# Altium integrated library PlantiumIntegratedLibrary.IntLib: 638 symbols (part 1 of 6)
Pins are listed as number, name and electrical type; pins without a type are passive.

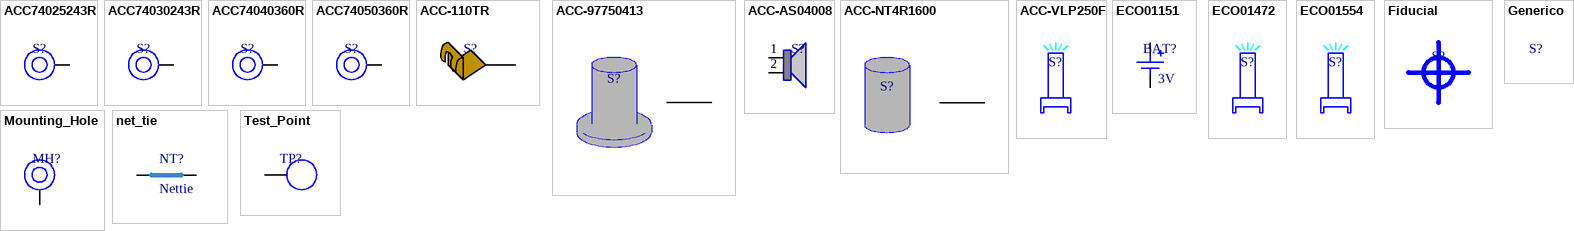
[diagram p0: symbols ACC74025243R to Test_Point]

## ACC74025243R
designator S?
Steel Spacer. Round Standoff Threaded M2x0.4 Steel 0.098" (2.50mm); Manufacturer Part Number: 9774025243R; Manufacturer: Würth Elektronik; Working Temperature: -55º to 150º; Short Description: RND STANDOFF M2X0.4 STEEL 2.5MM; Temperature Coefficient: *; Mounting: SMD; Power: *; Ratings: *; Type: Round Standoff; Frequency: *; Alternate Part Number 1: *; Alternate Part Number 2: *; Tolerance: *; Current: *; Revision Date: 31/03/23; Package Reference: *; Voltage: *; Value: *
footprint 9774025243 (SMT Steel Spacer with internal Thread M2, height 2.5mm)
pins: 1

## ACC74030243R
designator S?
Steel Spacer. Round Standoff Threaded M2x0.4 Steel 0.118" (3.00mm); Manufacturer Part Number: 9774030243R; Manufacturer: Würth Elektronik; Working Temperature: -55º to 150º; Short Description: RND STANDOFF M2X0.4 STEEL 3MM; Temperature Coefficient: *; Mounting: SMD; Power: *; Ratings: *; Type: Round Standoff; Frequency: *; Alternate Part Number 1: *; Alternate Part Number 2: *; Tolerance: *; Current: *; Revision Date: 01/05/23; Package Reference: *; Voltage: *; Value: *
footprint 9774030243 (SMT Steel Spacer with internal Thread M2, height 3mm)
pins: 1

## ACC74040360R
designator S?
Steel Spacer. Round Standoff Threaded M3x0.5 Steel 0.157" (4.00mm); Manufacturer Part Number: 9774040360R; Manufacturer: Würth Elektronik; Working Temperature: -55º to 150º; Short Description: ROUND STANDOFF M3X0.5 STEEL 4MM; Temperature Coefficient: *; Mounting: SMD; Power: *; Ratings: *; Type: Round Standoff; Frequency: *; Alternate Part Number 1: *; Alternate Part Number 2: *; Tolerance: *; Current: *; Revision Date: 31/03/23; Package Reference: *; Voltage: *; Value: *
footprint 9774040360 (Steel Spacer M3 Thread Internal, Length 4mm)
pins: 1

## ACC74050360R
designator S?
Steel Spacer. Round Standoff Threaded M3x0.5 Steel 0.197" (5.00mm); Manufacturer Part Number: 9774050360R; Manufacturer: Würth Elektronik; Working Temperature: -55º to 150º; Short Description: ROUND STANDOFF M3X0.5 STEEL 5MM; Temperature Coefficient: *; Mounting: SMD; Power: *; Ratings: *; Type: Round Standoff; Frequency: *; Alternate Part Number 1: *; Alternate Part Number 2: *; Tolerance: *; Current: *; Revision Date: 01/05/23; Package Reference: *; Voltage: *; Value: *
footprint 9774050360 (M3 Thread Internal, Length 5mm)
pins: 1

## ACC-110TR
designator S?
Battery Contact Spring (Leaf) Multiple 1 Cell SMD (SMT) Tab; Manufacturer Part Number: 110TR; Manufacturer: Keystone Electronics; Working Temperature: NC; Short Description: BATT CONT SPRING MULT 1 CELL SMD; Ratings: REACH, ROHS3; Value: NC; Temperature Coefficient: NC; Mounting: SMT; Power: NC; Type: NC; Frequency: NC; Alternate Part Number 1: *; Alternate Part Number 2: *; Tolerance: NC; Current: NC; Revision Date: 06/05/22; Package Reference: NC; Voltage: NC
footprint 110TR
pins: 1

## ACC-97750413
designator S?
Round Standoff Threaded M3 Steel 0.039" (1.00mm) -; Manufacturer Part Number: *; Working Temperature: *; Temperature Coefficient: *; Mounting: *; Short Description: *; Power: *; Ratings: *; Type: *; Frequency: *; Alternate Part Number 1: *; Alternate Part Number 2: *; Manufacturer: *; Tolerance: *; Current: *; Revision Date: *; Package Reference: *; Voltage: *; Value: *
pins: 0

## ACC-AS04008
designator S?
8 Ohms General Purpose Speaker 2 W 200 Hz ~ 20 kHz Top Oval, Rectangular Frame; Manufacturer Part Number: AS04008CO-WR-R; Manufacturer: PUI Audio, Inc.; Working Temperature: NC; Mounting: NC; Short Description: SPEAKER 8OHM 2W 83DB 20X40MM; Power: 2W; Ratings: ROHS3; Value: NC; Temperature Coefficient: NC; Type: NC; Frequency: 200 Hz ~ 20 kHz; Alternate Part Number 1: *; Alternate Part Number 2: *; Tolerance: NC; Current: NC; Revision Date: 16/11/21; Package Reference: NC; Voltage: NC
pins: 1, 2

## ACC-NT4R1600
designator S?
Connector Standoff For PCI Express Mini Card; Manufacturer Part Number: NT4R1600; Manufacturer: JAE Electronics; Working Temperature: NC; Mounting: NC; Short Description: STANDOFF FOR MM60 SERIES; Ratings: ROHS; Value: NC; Temperature Coefficient: NC; Power: NC; Type: NC; Frequency: NC; Alternate Part Number 1: *; Alternate Part Number 2: *; Tolerance: NC; Current: NC; Revision Date: 03/08/21; Package Reference: NC; Voltage: NC
pins: 0

## ACC-VLP250F
designator S?
Light Pipe Single Clear Rigid Board Mount, Press Fit; Manufacturer Part Number: VLP-250-F; Manufacturer: Bivar Inc.; Working Temperature: NC; Short Description: LIGHT PIPE CLEAR 3MM LENS FLAT; Ratings: ROHS3; Value: NC; Temperature Coefficient: NC; Mounting: THT; Power: NC; Type: NC; Frequency: NC; Alternate Part Number 1: *; Alternate Part Number 2: *; Tolerance: NC; Current: NC; Revision Date: 04/05/22; Package Reference: NC; Voltage: NC
footprint VLP-250-F (Light Pipe Vert SMD Flat Face)

## ECO01151
designator BAT?  value 3V
Battery Lithium coin 3V 20mm horizontal; Manufacturer Part Number: VL-2020/HFN; Manufacturer: Panasonic - BSG; Working Temperature: NC; Short Description: BATT LITH 3V 20MAH COIN 20.0MM; Temperature Coefficient: NC; Mounting: PC Pin (Horizontal Mount); Power: NC; Ratings: NC; Type: NC; Frequency: NC; Alternate Part Number 1: *; Alternate Part Number 2: *; Tolerance: NC; Current: NC; Revision Date: 02/01/22; Package Reference: Coin, 20.0mm; Voltage: 3V; ComponentLink1Description: Datasheet; ComponentLink1URL: https://api.pim.na.industrial.panasonic.com/file_stream/main/fileversion/3570; ComponentLink2Description: Product page; ComponentLink2URL: https://industrial.panasonic.com/ww/products/pt/coin_rechargeable_lithium/models/VL2020
footprint VL-2020/HFN ((21.5mm x 20.3mm x 4.5mm))
pins: 1 (power), 2 (power)

## ECO01472
designator S?
Light Pipe Single Clear Rigid Board Mount, Press Fit; Manufacturer Part Number: VLP-200-F; Manufacturer: Bivar Inc.; Working Temperature: NC; Mounting: NC; Short Description: LIGHT PIPE VERT 0.200" FLAT FACE; Ratings: ROHS3; Value: NC; Temperature Coefficient: NC; Power: NC; Type: NC; Frequency: NC; Alternate Part Number 1: *; Alternate Part Number 2: *; Tolerance: NC; Current: NC; Revision Date: 02/09/21; Package Reference: NC; Voltage: NC
footprint VLP-200-F (Footprint not found)

## ECO01554
designator S?
Light Pipe Single Clear Rigid Board Mount, Press Fit; Manufacturer Part Number: VLP-650-F; Manufacturer: Bivar Inc.; Working Temperature: NC; Short Description: LIGHT PIPE RIGID 3.00MM; Ratings: ROHS; Value: NC; Temperature Coefficient: NC; Mounting: THT; Power: NC; Type: NC; Frequency: NC; Alternate Part Number 1: *; Alternate Part Number 2: *; Tolerance: NC; Current: NC; Revision Date: 14/06/23; Package Reference: NC; Voltage: NC
footprint VLP-650-F

## Fiducial
designator S?  (no BOM)
Fiducial Mark; Working Temperature: NC; Short Description: Fiducail Mark; Value: NC; Temperature Coefficient: NC; Type: NC; Alternate Part Number 1: *; Alternate Part Number 2: *; Tolerance: NC; Revision Date: 31/1/23; Voltage: NC
footprint FIDROUND1X2 (Fiducial rounded 1mm - 2mm)

## Generico
designator S?
Manufacturer Part Number: 9775041360R; Manufacturer: Würth Elektronik; Working Temperature: NC; Mounting: NC; Short Description: ROUND STANDOFF M3 STEEL 1MM; Ratings: ROHS3; Value: NC; Temperature Coefficient: NC; Power: NC; Type: NC; Frequency: NC; Alternate Part Number 1: *; Alternate Part Number 2: *; Tolerance: NC; Current: NC; Revision Date: 03/08/21; Package Reference: NC; Voltage: NC

## Mounting_Hole
designator MH?  (no BOM)
Mounting Hole; Manufacturer Part Number: NC; Mounting: NC; Value: NC; Working Temperature: NC; Temperature Coefficient: NC; Short Description: Mounting Hole; Power: NC; Ratings: NC; Type: NC; Frequency: NC; Alternate Part Number 1: NC; Alternate Part Number 2: NC; Manufacturer: NC; Tolerance: NC; Current: NC; Revision Date: 03/04/23; Package Reference: NC; Voltage: NC
footprint mounting_hole
footprint MOUNTING_HOLE_3MM
pins: 1

## net_tie
designator NT?, comment Nettie  (net tie, no BOM)
There are situations when you need to intentionally connect two different nets. This is not a simple naming issue. It is when two nets need to be shorted as a design requirement. An example could be when you need to connect an Analog ground and a Digital ground in a controlled way.
footprint NETTIE
pins: 1, 2

## Test_Point
designator TP?  (no BOM)
Test point; Manufacturer Part Number: NC; Mounting: NC; Value: NC; Working Temperature: NC; Temperature Coefficient: NC; Short Description: Test point; Power: NC; Ratings: NC; Type: NC; Frequency: NC; Alternate Part Number 1: NC; Alternate Part Number 2: NC; Manufacturer: NC; Tolerance: NC; Current: NC; Revision Date: 03/04/23; Package Reference: NC; Voltage: NC
footprint Test_point
pins: 1


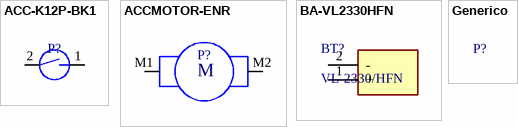
[diagram p1: symbols ACC-K12P-BK1 to Generico]

## ACC-K12P-BK1
designator P?
Manufacturer Part Number: K12P BK 1.5 5N; Manufacturer: C&K; Working Temperature: -40°C ~ 85°C; Temperature Coefficient: NC; Short Description: SWITCH PUSH SPST-NO 0.1A 30V; Ratings: REACH, ROHS3; Current: 100mA; Voltage: 30V; Value: NC; Mounting: THT; Power: NC; Type: Keyswitch; Frequency: NC; Alternate Part Number 1: *; Alternate Part Number 2: *; Tolerance: NC; Revision Date: 03/08/21; Package Reference: *
footprint K12P BK 1.5 5N
pins: 1, 2

## ACCMOTOR-ENR
designator P?
Micro Metal Gearmotors, 12 CPR, 2.7-18V; Manufacturer Part Number: *; Working Temperature: *; Temperature Coefficient: *; Mounting: SMT; Short Description: *; Power: *; Ratings: *; Type: *; Frequency: *; Alternate Part Number 1: *; Alternate Part Number 2: *; Manufacturer: *; Tolerance: *; Current: *; Revision Date: 15/10/21; Package Reference: *; Voltage: *; Value: *
footprint MOTOR_ENR (Footprint not found)
pins: M1 1, M2 2
text: M

## BA-VL2330HFN
designator BT?, comment VL-2330/HFN
Coin Cell Battery 3V 50mAH RECHG W/TABS. Vanadium Pentoxide Lithium; Manufacturer_Name: Panasonic; Datasheet Link: https://industrial.panasonic.com/ww/products/pt/coin_rechargeable_lithium/models/VL2020; Height: 4.05mm; Manufacturer_Part_Number: VL-2330/HFN; Mounting: Through hole
footprint VL2330HFN
pins: 1 +, 2 -

## Generico
designator P?
Manufacturer Part Number: *; Working Temperature: *; Temperature Coefficient: *; Mounting: *; Short Description: *; Power: *; Ratings: *; Type: *; Frequency: *; Alternate Part Number 1: *; Alternate Part Number 2: *; Manufacturer: *; Tolerance: *; Current: *; Revision Date: *; Package Reference: *; Voltage: *; Value: *


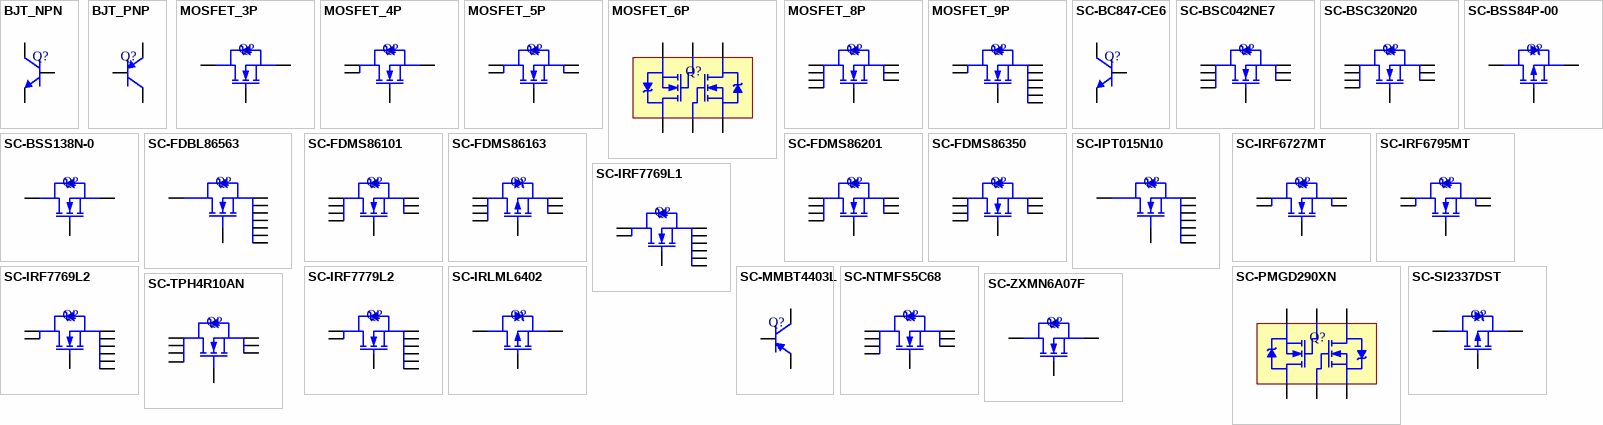
[diagram p2: symbols BJT_NPN to SC-ZXMN6A07F]

## BJT_NPN
designator Q?
Manufacturer Part Number: *; Working Temperature: *; Temperature Coefficient: *; Short Description: *; Power: *; Ratings: *; Type: *; Frequency: *; Alternate Part Number 1: *; Alternate Part Number 2: *; Manufacturer: *; Tolerance: *; Current: *; Revision Date: 04/08/21; Package Reference: *; Voltage: *; Value: *
pins: 1 B, 2 E, 3 C

## BJT_PNP
designator Q?
Manufacturer Part Number: *; Working Temperature: *; Temperature Coefficient: *; Short Description: *; Power: *; Ratings: *; Type: *; Frequency: *; Alternate Part Number 1: *; Alternate Part Number 2: *; Manufacturer: *; Tolerance: *; Current: *; Revision Date: 04/08/21; Package Reference: *; Voltage: *; Value: *
pins: 1 B, 2 E, 3 C

## MOSFET_3P
designator Q?
Manufacturer Part Number: *; Working Temperature: *; Temperature Coefficient: *; Short Description: *; Power: *; Ratings: *; Type: *; Frequency: *; Alternate Part Number 1: *; Alternate Part Number 2: *; Manufacturer: *; Tolerance: *; Current: *; Revision Date: 04/08/21; Package Reference: *; Voltage: *; Value: *
pins: 1 S, 2 G, 3 D

## MOSFET_4P
designator Q?
Manufacturer Part Number: *; Working Temperature: *; Temperature Coefficient: *; Short Description: *; Power: *; Ratings: *; Type: *; Frequency: *; Alternate Part Number 1: *; Alternate Part Number 2: *; Manufacturer: *; Tolerance: *; Current: *; Revision Date: 04/08/21; Package Reference: *; Voltage: *; Value: *
pins: 1 S, 2 D, 3 D, 4 G

## MOSFET_5P
designator Q?
Manufacturer Part Number: *; Working Temperature: *; Temperature Coefficient: *; Short Description: *; Power: *; Ratings: *; Type: *; Frequency: *; Alternate Part Number 1: *; Alternate Part Number 2: *; Manufacturer: *; Tolerance: *; Current: *; Revision Date: 04/08/21; Package Reference: *; Voltage: *; Value: *
pins: 1 S, 2 S, 3 D, 4 D, 5 G

## MOSFET_6P
designator Q?
Manufacturer Part Number: *; Working Temperature: *; Temperature Coefficient: *; Short Description: *; Power: *; Ratings: *; Type: *; Frequency: *; Alternate Part Number 1: *; Alternate Part Number 2: *; Manufacturer: *; Tolerance: *; Current: *; Revision Date: 04/08/21; Package Reference: *; Voltage: *; Value: *
pins: 1 S, 2 G, 3 D, 4 S, 5 G, 6 D

## MOSFET_8P
designator Q?
Manufacturer Part Number: *; Working Temperature: *; Temperature Coefficient: *; Short Description: *; Power: *; Ratings: *; Type: *; Frequency: *; Alternate Part Number 1: *; Alternate Part Number 2: *; Manufacturer: *; Tolerance: *; Current: *; Revision Date: 04/08/21; Package Reference: *; Voltage: *; Value: *
pins: 1 S, 2 S, 3 S, 4 G, 5 D, 6 D, 7 D, 8 D

## MOSFET_9P
designator Q?
Manufacturer Part Number: *; Working Temperature: *; Temperature Coefficient: *; Short Description: *; Power: *; Ratings: *; Type: *; Frequency: *; Alternate Part Number 1: *; Alternate Part Number 2: *; Manufacturer: *; Tolerance: *; Current: *; Revision Date: 04/08/21; Package Reference: *; Voltage: *; Value: *
pins: 1 S, 2 S, 3 S, 4 S, 5 S, 6 S, 7 D, 8 D, 9 G

## SC-BC847-CE6
designator Q?
Bipolar (BJT) Transistor NPN 45 V 100 mA 250MHz 330 mW Surface Mount SOT-23-3; Manufacturer Part Number: BC847CE6327; Alternate Part Number 1: ND; Manufacturer: Infineon Technologies; Working Temperature: 150°C (TJ); Temperature Coefficient: NC; Short Description: TRANS NPN 45V 100MA SOT23-3; Power: 330 mW; Ratings: REACH, ROHS3; Current: 100mA; Voltage: 45V; Value: 420; Mounting: SMT; Type: NPN; Frequency: NC; Alternate Part Number 2: ND; Tolerance: NC; Revision Date: 04/08/21; Package Reference: SOT-23-3
footprint SOT-23-3
pins: 1 B, 2 E, 3 C

## SC-BSC042NE7
designator Q?
N-Channel 75 V 19A (Ta), 100A (Tc) 2.5W (Ta), 125W (Tc) Surface Mount PG-TDSON-8-1; Manufacturer Part Number: BSC042NE7NS3GATMA1; Alternate Part Number 1: ND; Manufacturer: Infineon Technologies; Working Temperature: -55°C ~ 150°C (TJ); Temperature Coefficient: NC; Short Description: MOSFET N-CH 75V 19A/100A TDSON; Ratings: REACH, ROHS3; Voltage: 75V; Value: 4.2m; Mounting: SMT; Power: 2.5W (Ta), 125W (Tc); Type: N-Channel; Frequency: NC; Alternate Part Number 2: ND; Tolerance: NC; Current: 19A (Ta), 100A (Tc); Revision Date: 04/08/21; Package Reference: PowerTDFN-8
footprint PQFN-8
pins: 1 S, 2 S, 3 S, 4 G, 5 D, 6 D, 7 D, 8 D

## SC-BSC320N20
designator Q?
N-Channel 200 V 36A (Tc) 125W (Tc) Surface Mount PG-TDSON-8-1; Manufacturer Part Number: BSC320N20NS3 G; Alternate Part Number 1: ND; Manufacturer: Infineon Technologies; Working Temperature: -55°C ~ 150°C (TJ); Temperature Coefficient: NC; Short Description: MOSFET N-CH 200V 36A TDSON-8; Ratings: REACH, ROHS3; Voltage: 200V; Value: 32m; Mounting: SMT; Power: 125W (Tc); Type: N-Channel; Frequency: NC; Alternate Part Number 2: ND; Tolerance: NC; Current: 36A (Tc); Revision Date: 04/08/21; Package Reference: PowerTDFN-8
footprint PQFN-8
pins: 1 S, 2 S, 3 S, 4 G, 5 D, 6 D, 7 D, 8 D

## SC-BSS84P-00
designator Q?
P-Channel 50 V 130mA (Ta) 250mW (Tc) Surface Mount TO-236AB; Manufacturer Part Number: BSS84PH6433XTMA1; Alternate Part Number 1: BSS84,215; Alternate Part Number 2: ND; Manufacturer: Nexperia USA Inc.; Working Temperature: -65°C ~ 150°C (TJ); Temperature Coefficient: NC; Short Description: MOSFET P-CH 50V 130MA TO236AB; Ratings: REACH, ROHS3; Voltage: 50V; Value: 10; Mounting: SMT; Power: 250mW (Tc); Type: P-Channel; Frequency: NC; Tolerance: NC; Current: 130mA (Ta); Revision Date: 04/08/21; Package Reference: SOT-23-3
footprint SOT-23-3
pins: 1 G, 2 S, 3 D

## SC-BSS138N-0
designator Q?
N-Channel 60 V 230mA (Ta) 360mW (Ta) Surface Mount SOT-23-3; Manufacturer Part Number: BSS138N H6327; Alternate Part Number 1: ND; Manufacturer: Infineon Technologies; Working Temperature: -55°C ~ 150°C (TJ); Temperature Coefficient: NC; Short Description: MOSFET N-CH 60V 230MA SOT23-3; Ratings: REACH, ROHS3; Voltage: 60V; Value: 3.5; Mounting: SMT; Power: 360mW (Ta); Type: N-Channel; Frequency: NC; Alternate Part Number 2: ND; Tolerance: NC; Current: 230mA (Ta); Revision Date: 04/08/21; Package Reference: SOT-23-3
footprint SOT-23-3
pins: 1 G, 2 S, 3 D

## SC-FDBL86563
designator Q?
N-Channel 60 V 240A (Tc) 357W (Tj) Surface Mount PG-HSOF-8-1; Manufacturer Part Number: FDBL86563-F085; Alternate Part Number 1: ND; Manufacturer: onsemi; Working Temperature: -55°C ~ 175°C (TJ); Temperature Coefficient: NC; Short Description: MOSFET N-CH 60V 240A 8HPSOF; Ratings: REACH, ROHS3; Voltage: 60V; Value: 1,5mOhm; Mounting: SMT; Power: 357W (Tj); Type: N-Channel; Frequency: NC; Alternate Part Number 2: ND; Tolerance: NC; Current: 240A (Tc); Revision Date: 04/04/23; Package Reference: PG-HSOF-8
footprint PG-HSOF-8
pins: 1 G, 2 S, 3 S, 4 S, 5 S, 6 S, 7 S, 8 S, TAP D

## SC-FDMS86101
designator Q?
N-Channel 100 V 12.4A (Ta), 60A (Tc) 2.5W (Ta), 104W (Tc) Surface Mount 8-PQFN (5x6); Manufacturer Part Number: FDMS86101; Alternate Part Number 1: ND; Manufacturer: ON Semiconductor; Working Temperature: -55°C ~ 150°C (TJ); Temperature Coefficient: NC; Short Description: MOSFET N-CH 100V 12.4A/60A 8PQFN; Ratings: REACH, ROHS3; Voltage: 100V; Value: 8m; Mounting: SMT; Power: 2.5W (Ta), 104W (Tc); Type: N-Channel; Frequency: NC; Alternate Part Number 2: ND; Tolerance: NC; Current: 12.4A (Ta), 60A (Tc); Revision Date: 04/08/21; Package Reference: PowerTDFN-8
footprint PQFN-8
pins: 1 S, 2 S, 3 S, 4 G, 5 D, 6 D, 7 D, 8 D

## SC-FDMS86163
designator Q?
P-Channel 100 V 7.9A (Ta), 50A (Tc) 2.5W (Ta), 104W (Tc) Surface Mount 8-PQFN (5x6); Manufacturer Part Number: FDMS86163P; Alternate Part Number 1: ND; Manufacturer: ON Semiconductor; Working Temperature: -55°C ~ 150°C (TJ); Temperature Coefficient: NC; Short Description: MOSFET P-CH 100V 7.9A/50A 8PQFN; Ratings: REACH, ROHS3; Voltage: 100V; Value: 8m; Mounting: SMT; Power: 2.5W (Ta), 104W (Tc); Type: P-Channel; Frequency: NC; Alternate Part Number 2: ND; Tolerance: NC; Current: 7.9A (Ta), 50A (Tc); Revision Date: 20/09/21; Package Reference: PowerTDFN-8
footprint PQFN-8
pins: 1 S, 2 S, 3 S, 4 G, 5 D, 6 D, 7 D, 8 D

## SC-FDMS86201
designator Q?  (value not drawn)
N-Channel 120 V 11.6A (Ta), 49A (Tc) 2.5W (Ta), 104W (Tc) Surface Mount 8-PQFN (5x6); Alternate Part Number 1: ND; Manufacturer: ON Semiconductor; Working Temperature: -55°C ~ 150°C (TJ); Temperature Coefficient: NC; Short Description: MOSFET N-CH 120V 11.6A/49A 8PQFN; Ratings: REACH, ROHS3; Current: 11.6A (Ta), 60A (Tc); Voltage: 120V; Value: 8m; Manufacturer Part Number: FDMS86201; Mounting: SMT; Power: 2.5W (Ta), 104W (Tc); Type: N-Channel; Frequency: NC; Alternate Part Number 2: ND; Tolerance: NC; Revision Date: 04/08/21; Package Reference: PowerTDFN-8
footprint PQFN-8
pins: 1 S, 2 S, 3 S, 4 G, 5 D, 6 D, 7 D, 8 D

## SC-FDMS86350
designator Q?
N-Channel 80 V 25A (Ta), 198A (Tc) 3.3W (Ta), 187W (Tc) Surface Mount 8-PQFN (5x6); Manufacturer Part Number: FDMS86350ET80; Alternate Part Number 1: ND; Manufacturer: ON Semiconductor; Working Temperature: -55°C ~ 175°C (TJ); Temperature Coefficient: NC; Short Description: MOSFET N-CH 80V 25A/198A POWER56; Ratings: REACH, ROHS3; Voltage: 80V; Value: 2.4m; Mounting: SMT; Power: 3.3W (Ta), 187W (Tc); Type: N-Channel; Frequency: NC; Alternate Part Number 2: ND; Tolerance: NC; Current: 25A (Ta), 198A (Tc); Revision Date: 04/08/21; Package Reference: PowerTDFN-8
footprint PQFN-8
pins: 1 S, 2 S, 3 S, 4 G, 5 D, 6 D, 7 D, 8 D

## SC-IPT015N10
designator Q?
N-Channel 100 V 300A (Tc) 375W (Tc) Surface Mount PG-HSOF-8-1; Manufacturer Part Number: IPT015N10N5ATMA1; Alternate Part Number 1: ND; Manufacturer: Infineon Technologies; Working Temperature: -55°C ~ 175°C (TJ); Temperature Coefficient: NC; Short Description: MOSFET N-CH 100V 300A 8HSOF; Ratings: REACH, ROHS3; Voltage: 100V; Value: 1,5mOhm; Mounting: SMT; Power: 375W (Tc); Type: N-Channel; Frequency: NC; Alternate Part Number 2: ND; Tolerance: NC; Current: 300A (Tc); Revision Date: 03/04/23; Package Reference: PG-HSOF-8
footprint PG-HSOF-8
pins: 1 G, 2 S, 3 S, 4 S, 5 S, 6 S, 7 S, 8 S, TAP D

## SC-IRF6727MT
designator Q?
N-Channel 30 V 32A (Ta), 180A (Tc) 2.8W (Ta), 89W (Tc) Surface Mount DIRECTFET™ MX; Manufacturer Part Number: IRF6727MTRPBF; Alternate Part Number 1: ND; Manufacturer: Infineon Technologies; Working Temperature: -40°C ~ 150°C (TJ); Temperature Coefficient: NC; Short Description: MOSFET N-CH 30V 32A DIRECTFET; Ratings: REACH, ROHS3; Voltage: 30V; Value: 1.7m; Mounting: SMT; Power: 2.8W (Ta), 89W (Tc); Type: N-Channel; Frequency: NC; Alternate Part Number 2: ND; Tolerance: NC; Current: 32A (Ta), 180A (Tc); Revision Date: 04/08/21; Package Reference: DIRECTFET
footprint DIRECTFET-MX
pins: 1 G, 2 S, 2 S, 3 D, 3 D

## SC-IRF6795MT
designator Q?
N-Channel 25 V 32A (Ta), 160A (Tc) 2.8W (Ta), 75W (Tc) Surface Mount DIRECTFET™ MX; Manufacturer Part Number: IRF6795MTRPBF; Alternate Part Number 1: ND; Manufacturer: Infineon Technologies; Working Temperature: -40°C ~ 150°C (TJ); Temperature Coefficient: NC; Short Description: MOSFET N-CH 25V 32A DIRECTFET; Ratings: REACH, ROHS3; Voltage: 25V; Value: 1.8m; Mounting: SMT; Power: 2.8W (Ta), 75W (Tc); Type: N-Channel; Frequency: NC; Alternate Part Number 2: ND; Tolerance: NC; Current: 32A (Ta), 160A (Tc); Revision Date: 04/08/21; Package Reference: DIRECTFET
footprint DIRECTFET-MX
pins: 1 G, 2 S, 2 S, 3 D, 3 D

## SC-IRF7769L1
designator Q?
N-Channel 25 V 22A (Ta), 95A (Tc) 2.2W (Ta), 42W (Tc) Surface Mount DIRECTFET™ SQ; Manufacturer Part Number: IRF7769L1TRPBF; Alternate Part Number 1: ND; Manufacturer: Infineon Technologies; Working Temperature: -40°C ~ 150°C (TJ); Temperature Coefficient: NC; Short Description: MOSFET N-CH 25V 22A DIRECTFET; Ratings: REACH; Voltage: 25V; Value: 3m; Mounting: SMT; Power: 2.2W (Ta), 42W (Tc); Type: N-Channel; Frequency: NC; Alternate Part Number 2: ND; Tolerance: NC; Current: 22A (Ta), 95A (Tc); Revision Date: 04/08/21; Package Reference: DIRECTFET
footprint DIRECTFET-L8
pins: 1 G, 2 S, 2 S, 2 S, 2 S, 2 S, 2 S, 3 D, 3 D

## SC-IRF7769L2
designator Q?
N-Channel 100 V 375A (Tc) 3.3W (Ta), 125W (Tc) Surface Mount DirectFET™ Isometric L8; Manufacturer Part Number: IRF7769L2TR1PBF; Alternate Part Number 1: ND; Manufacturer: Infineon Technologies; Working Temperature: -55°C ~ 175°C (TJ); Temperature Coefficient: NC; Short Description: MOSFET N-CH 100V 375A DIRECTFET; Ratings: REACH; Voltage: 100V; Value: 3.5m; Mounting: SMT; Power: 3.3W (Ta), 125W (Tc); Type: N-Channel; Frequency: NC; Alternate Part Number 2: ND; Tolerance: NC; Current: 375A (Tc); Revision Date: 04/08/21; Package Reference: DIRECTFET
footprint DIRECTFET-L8
pins: 1 G, 2 S, 2 S, 2 S, 2 S, 2 S, 2 S, 3 D, 3 D

## SC-IRF7779L2
designator Q?
N-Channel 150 V 67A (Tc) 3.3W (Ta), 125W (Tc) Surface Mount DirectFET™ Isometric L8; Manufacturer Part Number: IRF7779L2TRPBF; Alternate Part Number 1: ND; Manufacturer: Infineon Technologies; Working Temperature: -55°C ~ 175°C (TJ); Temperature Coefficient: NC; Short Description: MOSFET N-CH 150V 375A DIRECTFET; Ratings: REACH; Voltage: 150V; Value: 3.5m11mOhm @ 40A, 10V; Mounting: SMT; Power: 3.3W (Ta), 125W (Tc); Type: N-Channel; Frequency: NC; Alternate Part Number 2: ND; Tolerance: NC; Current: 67A (Tc); Revision Date: 04/08/22; Package Reference: DIRECTFET
footprint DIRECTFET-L8
pins: 1 G, 2 S, 2 S, 2 S, 2 S, 2 S, 2 S, 3 D, 3 D

## SC-IRLML6402
designator Q?
P-Channel 20 V 3.7A (Ta) 1.3W (Ta) Surface Mount Micro3™/SOT-23; Manufacturer Part Number: IRLML6402TRPBF; Alternate Part Number 1: ND; Manufacturer: Infineon Technologies; Working Temperature: -55°C ~ 150°C (TJ); Temperature Coefficient: NC; Short Description: MOSFET P-CH 20V 3.7A SOT23; Ratings: REACH, ROHS3; Voltage: 20V; Value: 65m; Mounting: SMT; Power: 1.3W (Ta); Type: P-Channel; Frequency: NC; Alternate Part Number 2: ND; Tolerance: NC; Current: 3.7A (Ta); Revision Date: 04/08/21; Package Reference: SOT-23-3
footprint SOT-23-3
pins: 1 G, 2 S, 3 D

## SC-MMBT4403L
designator Q?
Bipolar (BJT) Transistor PNP 40 V 600 mA 200MHz 300 mW Surface Mount SOT-23-3 (TO-236); Manufacturer Part Number: MMBT4403LT1G; Alternate Part Number 1: ND; Manufacturer: ON Semiconductor; Working Temperature: -55°C ~ 150°C (TJ); Temperature Coefficient: NC; Short Description: TRANS PNP 40V 600MA SOT23-3; Power: 300mW; Ratings: REACH, ROHS3; Current: 600mA; Voltage: 40V; Value: 100; Mounting: SMT; Type: PNP; Frequency: NC; Alternate Part Number 2: ND; Tolerance: NC; Revision Date: 04/08/21; Package Reference: SOT-23-3
footprint SOT-23-3
pins: 1 B, 2 E, 3 C

## SC-NTMFS5C68
designator Q?
N-Channel 25A (Tc) 28W (Tc) Surface Mount 5-DFN (5x6) (8-SOFL); Manufacturer Part Number: NTMFS5C682NLT1G; Alternate Part Number 1: ND; Manufacturer: ON Semiconductor; Working Temperature: -55°C ~ 175°C (TJ); Temperature Coefficient: NC; Short Description: MOSFET N-CH 60V 25A 5DFN; Ratings: REACH, ROHS3; Voltage: 60V; Value: NC; Mounting: SMT; Power: 28W (Tc); Type: N-Channel; Frequency: NC; Alternate Part Number 2: ND; Tolerance: NC; Current: 25A (Tc); Revision Date: 20/09/21; Package Reference: PowerTDFN-8
footprint PQFN-8
pins: 1 S, 2 S, 3 S, 4 G, 5 D, 6 D, 7 D, 8 D

## SC-PMGD290XN
designator Q?
Mosfet Array 2 N-Channel (Dual) 20V 860mA 410mW Surface Mount 6-TSSOP; Manufacturer Part Number: PMGD290XN T/R; Alternate Part Number 1: ND; Manufacturer: Nexperia USA Inc.; Working Temperature: -55°C ~ 150°C (TJ); Temperature Coefficient: NC; Short Description: MOSFET 2N-CH 20V 0.86A 6TSSOP; Ratings: REACH, ROHS3; Value: 350m; Mounting: SMT; Power: 410mW; Type: N-Channel (Dual); Frequency: NC; Alternate Part Number 2: ND; Tolerance: NC; Current: 860mA; Revision Date: 04/08/21; Package Reference: TSSOP-6; Voltage: 20V
footprint SOT-363-6
pins: 1 S, 2 G, 3 D, 4 S, 5 G, 6 D

## SC-SI2337DST
designator Q?, comment SI2337DS-T1-E3  (value not drawn)
P-Channel 80 V 2.2A (Tc) 760mW (Ta), 2.5W (Tc) Surface Mount SOT-23-3 (TO-236); Manufacturer Part Number: IRLML6402TRPBF; Alternate Part Number 1: ND; Manufacturer: Infineon Technologies; Working Temperature: -55°C ~ 150°C (TJ); Temperature Coefficient: NC; Short Description: MOSFET P-CH 20V 3.7A SOT23; Power: 1.3W (Ta); Ratings: REACH, ROHS3; Current: 3.7A (Ta); Voltage: 20V; Value: 65m; Mounting: SMT; Type: P-Channel; Frequency: NC; Alternate Part Number 2: ND; Tolerance: NC; Revision Date: 04/08/21; Package Reference: SOT-23-3
footprint SOT-23-3
pins: 1 G, 2 S, 3 D

## SC-TPH4R10AN
designator Q?
N-Channel 100 V 70A (Tc) 67W (Tc) Surface Mount 2-5Q1S; Manufacturer Part Number: TPH4R10ANL; Alternate Part Number 1: ND; Manufacturer: TOSHIBA; Working Temperature: -55°C ~ 150°C (TJ); Temperature Coefficient: NC; Short Description: MOSFET N-CH 100V 300A 8HSOF; Ratings: REACH, ROHS3; Voltage: 100V; Value: 3,3mOhm; Mounting: SMT; Power: 67W (Tc); Type: N-Channel; Alternate Part Number 2: ND; Tolerance: NC; Current: 70A (Tc); Revision Date: 03/04/23; Package Reference: 2-5Q1S (SOP Advance); ComponentLink1Description: Datasheet; ComponentLink1URL: https://toshiba.semicon-storage.com/info/TPH4R10ANL_datasheet_en_20191018.pdf?did=55592&prodName=TPH4R10ANL
footprint PQFN-8
pins: 1 S, 2 S, 3 S, 4 G, 5 D, 6 D, 7 D, 8 D

## SC-ZXMN6A07F
designator Q?
N-Channel 60 V 1.2A (Ta) 625mW (Ta) Surface Mount SOT-23-3; Manufacturer Part Number: ZXMN6A07FTA; Alternate Part Number 1: ND; Manufacturer: Diodes Incorporated; Working Temperature: -55°C ~ 150°C (TJ); Temperature Coefficient: NC; Short Description: MOSFET N-CH 60V 1.2A SOT23-3; Ratings: REACH, ROHS3; Voltage: 60V; Value: 250m; Mounting: SMT; Power: 625mW (Ta); Type: N-Channel; Frequency: NC; Alternate Part Number 2: ND; Tolerance: NC; Current: 1.2A (Ta); Revision Date: 04/08/21; Package Reference: SOT-23-3
footprint SOT-23-3
pins: 1 G, 2 S, 3 D


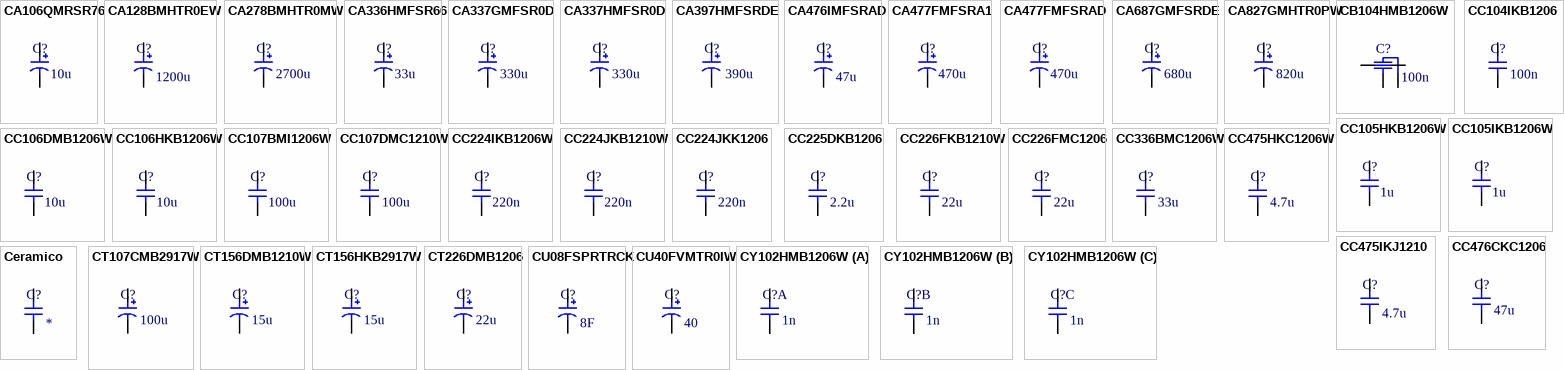
[diagram p3: symbols CA106QMRSR76 to CY102HMB1206W]

## CA106QMRSR76
designator C?  value 10u
10 µF 63 V Aluminum Electrolytic Capacitors Radial, Can - SMD - 2000 Hrs @ 85°C; Manufacturer Part Number: EDK106M063A9GAA; Manufacturer: KEMET; Working Temperature: -40°C ~ 85°C; Temperature Coefficient: NA; Short Description: CAP ALUM 10UF 20% 63V SMD; Power: NC; Ratings: REACH, ROHS3; Type: Aluminium; Tolerance: ±20%; Voltage: 63V; Mounting: SMT; Frequency: NC; Alternate Part Number 1: *; Alternate Part Number 2: *; Current: NC; Revision Date: 23/02/22; Package Reference: Radial
footprint C066x066-032x016(061) (Footprint not found)
pins: 1, 2

## CA128BMHTR0EW
designator C?  value 1200u
1200 µF 6.3 V Aluminum Electrolytic Capacitors Radial, Can - 6000 Hrs @ 105°C; Manufacturer Part Number: EEU-FR0J122B; Manufacturer: Panasonic Electronic Components; Working Temperature: -40°C ~ 105°C; Short Description: CAP ALUM 1200UF 20% 6.3V RADIAL; Power: NC; Ratings: REACH, ROHS3; Tolerance: ±20%; Voltage: 6.3 V; Temperature Coefficient: *; Mounting: THT; Type: *; Frequency: NC; Alternate Part Number 1: *; Alternate Part Number 2: *; Current: NC; Revision Date: 15/11/21; Package Reference: *
footprint C_THRAD_020x008x050
pins: 1, 2

## CA278BMHTR0MW
designator C?  value 2700u
2700 µF 6.3 V Aluminum Electrolytic Capacitors Radial, Can - 10000 Hrs @ 105°C; Manufacturer Part Number: UHW0J272MPD; Manufacturer: Nichicon; Working Temperature: -40°C ~ 105°C; Temperature Coefficient: NC; Short Description: CAP ALUM 2700UF 20% 6.3V RADIAL; Ratings: REACH, ROHS3; Type: Aluminium; Tolerance: ±20%; Voltage: 6.3V; Mounting: THT; Power: NC; Frequency: NC; Alternate Part Number 1: *; Alternate Part Number 2: *; Current: NC; Revision Date: 12/11/21; Package Reference: Radial
footprint C_THRAD_020x008x050
pins: 1, 2

## CA336HMFSR66
designator C?  value 33u
33 µF 50 V Aluminum Electrolytic Capacitors Radial, Can - SMD 880mOhm @ 100kHz 2000 Hrs @ 105°C; Manufacturer Part Number: EEE-FN1H330L; Manufacturer: Panasonic Electronic Components; Working Temperature: -55°C ~ 105°C; Temperature Coefficient: NA; Short Description: CAP ALUM 33UF 20% 50V SMD; Power: NC; Ratings: REACH, ROHS3, AEQ-200; Type: Aluminium; Tolerance: ±20%; Voltage: 50V; Mounting: SMT; Frequency: NC; Alternate Part Number 1: *; Alternate Part Number 2: *; Current: NC; Revision Date: 20/09/21; Package Reference: Radial
footprint C066x066-032x016(061) (Footprint not found)
pins: 1, 2

## CA337GMFSR0D
designator C?  value 330u
330 µF 35 V Aluminum Electrolytic Capacitors Radial, Can - SMD - 2000 Hrs @ 105°C; Manufacturer Part Number: EEE-FK1V331AP; Manufacturer: Panasonic Electronic Components; Working Temperature: -55°C ~ 105°C; Temperature Coefficient: NA; Short Description: CAP ALUM 330UF 20% 35V SMD; Power: NC; Ratings: REACH, ROHS3, AEQ-200; Type: Aluminium; Tolerance: ±20%; Voltage: 35V; Mounting: SMT; Frequency: NC; Alternate Part Number 1: *; Alternate Part Number 2: *; Current: NC; Revision Date: 22/12/21; Package Reference: Radial
footprint C103x103-041x020(105) (Footprint not found)
pins: 1, 2

## CA337HMFSR0D
designator C?  value 330u
330 µF 50 V Aluminum Electrolytic Capacitors Radial, Can - SMD 120mOhm @ 100kHz 2000 Hrs @ 105°C; Manufacturer Part Number: EEE-FT1H331AP; Manufacturer: Panasonic Electronic Components; Working Temperature: -55°C ~ 105°C; Temperature Coefficient: NA; Short Description: CAP ALUM 330UF 20% 50V SMD; Power: NC; Ratings: REACH, ROHS3, AEQ-200; Type: Aluminium; Tolerance: ±20%; Voltage: 50V; Mounting: SMT; Frequency: NC; Alternate Part Number 1: *; Alternate Part Number 2: *; Current: NC; Revision Date: 03/08/21; Package Reference: Radial
footprint C103x103-041x020(105) (Footprint not found)
pins: 1, 2

## CA397HMFSRDE
designator C?  value 390u
390 µF 50 V Aluminum Electrolytic Capacitors Radial, Can - SMD - 5000 Hrs @ 105°C; Manufacturer Part Number: EEV-FK1H391Q; Manufacturer: Panasonic Electronic Components; Working Temperature: -55°C ~ 105°C; Temperature Coefficient: NC; Short Description: CAP ALUM 390UF 20% 50V SMD; Ratings: REACH, ROHS3, AEQ-200; Type: Aluminium; Tolerance: ±20%; Voltage: 50V; Mounting: SMT; Power: NC; Frequency: NC; Alternate Part Number 1: *; Alternate Part Number 2: *; Current: NC; Revision Date: 03/08/21; Package Reference: Radial
footprint C135x135-057x020(138) (Footprint not found)
pins: 1, 2

## CA476IMFSRAD
designator C?  value 47u
47 µF 100 V Aluminum Electrolytic Capacitors Radial, Can - SMD 700mOhm @ 100kHz 2000 Hrs @ 105°C; Manufacturer Part Number: EEE-FN2A470UP; Manufacturer: Panasonic Electronic Components; Working Temperature: -55°C ~ 105°C; Temperature Coefficient: NC; Short Description: CAP ALUM 47UF 20% 100V SMD; Ratings: REACH, ROHS3, AEC-Q200; Type: Aluminium; Tolerance: ±20%; Voltage: 100V; Mounting: SMT; Power: NC; Frequency: NC; Alternate Part Number 1: *; Alternate Part Number 2: *; Current: NC; Revision Date: 02/09/21; Package Reference: Radial
footprint C103x103-041x020(105)
pins: 1, 2

## CA477FMFSRA1
designator C?  value 470u
470 µF 25 V Aluminum Electrolytic Capacitors Radial, Can - SMD - 2000 Hrs @ 105°C; Manufacturer Part Number: EEE-FK1E471P; Manufacturer: Panasonic Electronic Components; Working Temperature: -55°C ~ 105°C; Temperature Coefficient: NA; Short Description: CAP ALUM 470UF 20% 25V SMD; Power: NC; Ratings: REACH, ROHS3, AEQ-200; Type: Aluminium; Tolerance: ±20%; Voltage: 25V; Mounting: SMT; Frequency: NC; Alternate Part Number 1: *; Alternate Part Number 2: *; Current: NC; Revision Date: 03/08/21; Package Reference: Radial
footprint C103x103-041x020(105) (Footprint not found)
pins: 1, 2

## CA477FMFSRAD
designator C?  value 470u
470 µF 25 V Aluminum Electrolytic Capacitors Radial, Can - SMD 80mOhm @ 100kHz 5000 Hrs @ 105°C; Manufacturer Part Number: EEE-FT1E471GP; Manufacturer: Panasonic Electronic Components; Working Temperature: -55°C ~ 105°C; Temperature Coefficient: NA; Short Description: CAP ALUM 470UF 20% 25V SMD; Power: NC; Ratings: REACH, ROHS3, AEQ-200; Type: Aluminium; Tolerance: ±20%; Voltage: 25V; Mounting: SMT; Frequency: NC; Alternate Part Number 1: *; Alternate Part Number 2: *; Current: NC; Revision Date: 03/08/21; Package Reference: Radial
footprint C083x083-040x020(105) (Footprint not found)
pins: 1, 2

## CA687GMFSRDE
designator C?  value 680u
680 µF 35 V Aluminum Electrolytic Capacitors Radial, Can - SMD - 5000 Hrs @ 105°C; Manufacturer Part Number: EEV-FK1V681Q; Manufacturer: Panasonic Electronic Components; Working Temperature: -55°C ~ 105°C; Temperature Coefficient: NC; Short Description: CAP ALUM 680UF 20% 35V SMD; Ratings: REACH, ROHS3, AEQ-200; Type: Aluminium; Tolerance: ±20%; Voltage: 35V; Mounting: SMT; Power: NC; Frequency: NC; Alternate Part Number 1: *; Alternate Part Number 2: *; Current: NC; Revision Date: 22/12/21; Package Reference: Radial
footprint C135x135-057x020(138) (Footprint not found)
pins: 1, 2

## CA827GMHTR0PW
designator C?  value 820u
820 µF 35 V Aluminum Electrolytic Capacitors Radial, Can - 10000 Hrs @ 105°C; Manufacturer Part Number: UHW1V821MPD; Manufacturer: Nichicon; Working Temperature: -40°C ~ 105°C; Temperature Coefficient: NC; Short Description: CAP ALUM 820UF 20% 35V RADIAL; Ratings: REACH, ROHS3; Type: Aluminium; Tolerance: ±20%; Voltage: 35V; Mounting: THT; Power: NC; Frequency: NC; Alternate Part Number 1: *; Alternate Part Number 2: *; Current: NC; Revision Date: 14/10/21; Package Reference: Radial
footprint C_THRAD_020x008x050
pins: 1, 2

## CB104HMB1206W
designator C?  value 100n
0.1 µF ±20% 50V Ceramic Capacitor X7R 1206 (3216 Metric); Manufacturer Part Number: 500X18W104MV4E; Manufacturer: Johanson Dielectrics Inc.; Working Temperature: -55°C ~ 125°C; Short Description: CAP CER 0.1UF 50V X7R 1206; Power: NC; Ratings: ROHS3, REACH; Type: X2Y; Current: ND; Temperature Coefficient: X7R; Mounting: SMT; Frequency: NC; Alternate Part Number 1: *; Alternate Part Number 2: *; Tolerance: 20%; Revision Date: 15/10/21; Package Reference: 1206; Voltage: 50V
footprint C0805-4PC
pins: 1, 2, 3, 4

## CC104IKB1206
designator C?  value 100n
100 nF ±10% 100V Ceramic Capacitor X7R 1206 (3216 Metric); Manufacturer Part Number: 12061C104K4T2A; Manufacturer: AVX Corporation; Working Temperature: -55°C ~ 125°C; Short Description: CAP CER 0.1UF 100V X7R 1206; Power: NC; Ratings: REACH, ROHS3, AEQ-200; Type: MLCC; Temperature Coefficient: X7R; Mounting: SMT; Frequency: NC; Alternate Part Number 1: *; Alternate Part Number 2: *; Tolerance: ±10%; Current: NC; Revision Date: 03/08/21; Package Reference: 1206; Voltage: 100V
footprint C1206 (Footprint not found)
pins: 1, 2

## CC105HKB1206W
designator C?  value 1u
1 µF ±10% 50V Ceramic Capacitor X7R 1206 (3216 Metric); Manufacturer Part Number: GRM31CR71H105KA61L; Manufacturer: Murata Electronics; Working Temperature: -55°C ~ 125°C; Short Description: CAP CER 1UF 50V X7R 1206; Power: NC; Ratings: REACH, ROHS3; Type: MLCC; Temperature Coefficient: X7R; Mounting: SMT; Frequency: NC; Alternate Part Number 1: *; Alternate Part Number 2: *; Tolerance: ±10%; Current: NC; Revision Date: 03/08/21; Package Reference: 1206; Voltage: 50V
footprint C1206 (Footprint not found)
pins: 1, 2

## CC105IKB1206W
designator C?  value 1u
1 µF ±10% 100V Ceramic Capacitor X7R 1206 (3216 Metric); Manufacturer Part Number: C3216X7R2A105K160AA; Manufacturer: TDK Corporation; Working Temperature: -55°C ~ 125°C; Short Description: CAP CER 1UF 100V X7R 1206; Power: NC; Ratings: REACH, ROHS3; Type: MLCC; Temperature Coefficient: X7R; Mounting: SMT; Frequency: NC; Alternate Part Number 1: *; Alternate Part Number 2: *; Tolerance: ±10%; Current: NC; Revision Date: 03/08/21; Package Reference: 1206; Voltage: 100V
footprint C1206 (Footprint not found)
pins: 1, 2

## CC106DMB1206W
designator C?  value 10u
10 µF ±20% 16V Ceramic Capacitor X7R 1206 (3216 Metric); Manufacturer Part Number: C3216X7R1C106M; Manufacturer: Samsung Electro-Mechanics; Working Temperature: -55°C ~ 125°C; Short Description: CAP CER 10UF 16V X7R 1206; Power: NC; Ratings: REACH, ROHS3; Type: MLCC; Tolerance: ±10%; Temperature Coefficient: X7R; Mounting: SMT; Frequency: NC; Alternate Part Number 1: *; Alternate Part Number 2: *; Current: NC; Revision Date: 12/11/21; Package Reference: 1206; Voltage: 16V
footprint C1206 (Footprint not found)
pins: 1, 2

## CC106HKB1206W
designator C?  value 10u
10 µF ±10% 50V Ceramic Capacitor X7R 1206 (3216 Metric); Manufacturer Part Number: CL31B106KBHNNNE; Manufacturer: Samsung Electro-Mechanics; Working Temperature: -55°C ~ 125°C; Short Description: CAP CER 10UF 50V X7R 1206; Power: NC; Ratings: REACH, ROHS3; Type: MLCC; Temperature Coefficient: X7R; Mounting: SMT; Frequency: NC; Alternate Part Number 1: *; Alternate Part Number 2: *; Tolerance: ±10%; Current: NC; Revision Date: 03/08/21; Package Reference: 1206; Voltage: 50V
footprint C1206 (Footprint not found)
pins: 1, 2

## CC107BMI1206W
designator C?  value 100u
100 µF ±20% 6.3V Ceramic Capacitor X6T 1206 (3216 Metric); Manufacturer Part Number: GRM31CD80J107ME39L; Manufacturer: Murata Electronics; Working Temperature: -55°C ~ 105°C; Short Description: CAP CER 100UF 6.3V X6T 1206; Power: NC; Ratings: REACH, ROHS3; Type: MLCC; Temperature Coefficient: X6T; Mounting: SMT; Frequency: NC; Alternate Part Number 1: *; Alternate Part Number 2: *; Tolerance: ±20%; Current: NC; Revision Date: 03/08/21; Package Reference: 1206; Voltage: 6.3V
footprint C1206 (Footprint not found)
pins: 1, 2

## CC107DMC1210W
designator C?  value 100u
100 µF ±20% 16V Ceramic Capacitor X5R 1210 (3225 Metric); Manufacturer Part Number: GMC32X5R107M16NT; Manufacturer: CAL-CHIP ELECTRONICS, INC.; Working Temperature: -55°C ~ 85°C; Short Description: CAP CER 100UF 16V X5R 1210; Power: NC; Ratings: REACH, ROHS3; Type: MLCC; Temperature Coefficient: X5R; Mounting: SMT; Frequency: NC; Alternate Part Number 1: *; Alternate Part Number 2: *; Tolerance: ±20%; Current: NC; Revision Date: 15/10/21; Package Reference: 1210; Voltage: 16V
footprint C1210
pins: 1, 2

## CC224IKB1206W
designator C?  value 220n
220 nF ±10% 100V Ceramic Capacitor X7R 1206 (3216 Metric); Manufacturer Part Number: C3216X7R2A224K115AE; Manufacturer: TDK Corporation; Working Temperature: -55°C ~ 125°C; Short Description: CAP CER 0.22UF 100V X7R 1206; Power: NC; Ratings: REACH, ROHS3; Type: MLCC; Temperature Coefficient: X7R; Mounting: SMT; Frequency: NC; Alternate Part Number 1: *; Alternate Part Number 2: *; Tolerance: ±10%; Current: NC; Revision Date: 03/08/21; Package Reference: 1206; Voltage: 100V
footprint C1206 (Footprint not found)
pins: 1, 2

## CC224JKB1210W
designator C?  value 220n
220 nF ±10% 200V Ceramic Capacitor X7R 1210 (3225 Metric); Manufacturer Part Number: GRM32DR72D224KW01L; Manufacturer: Murata Electronics; Working Temperature: -55°C ~ 125°C; Short Description: CAP CER 0.22UF 200V X7R 1210; Power: NC; Ratings: REACH, ROHS3; Type: MLCC; Temperature Coefficient: X7R; Mounting: SMT; Frequency: NC; Alternate Part Number 1: *; Alternate Part Number 2: *; Tolerance: ±10%; Current: NC; Revision Date: 03/08/21; Package Reference: 1210; Voltage: 200V
footprint C1210 (Footprint not found)
pins: 1, 2

## CC224JKK1206
designator C?  value 220n
220 nF ±10% 200V Ceramic Capacitor X7T 1206 (3216 Metric); Manufacturer Part Number: CGJ5L3X7T2D224K160AA; Manufacturer: TDK Corporation; Working Temperature: -55°C ~ 125°C; Short Description: CAP CER 0.22UF 200V X7T 1206; Power: NC; Ratings: REACH, ROHS3, AEQ-200; Type: MLCC; Temperature Coefficient: X7T; Mounting: SMT; Frequency: NC; Alternate Part Number 1: *; Alternate Part Number 2: *; Tolerance: ±10%; Current: NC; Revision Date: 03/08/21; Package Reference: 1206; Voltage: 200V
footprint C1206 (Footprint not found)
pins: 1, 2

## CC225DKB1206
designator C?  value 2.2u
2.2 µF ±10% 16V Ceramic Capacitor X7R 1206 (3216 Metric); Manufacturer Part Number: C3216X7R1C225K; Manufacturer: TDK Corporation; Working Temperature: -55°C ~ 125°C; Short Description: CAP CER 2.2UF 16V X7R 1206; Power: NC; Ratings: REACH, ROHS3, AEQ-200; Type: MLCC; Temperature Coefficient: X7R; Mounting: SMT; Frequency: NC; Alternate Part Number 1: *; Alternate Part Number 2: *; Tolerance: ±10%; Current: NC; Revision Date: 03/08/21; Package Reference: 1206; Voltage: 16V
footprint C1206 (Footprint not found)
pins: 1, 2

## CC226FKB1210W
designator C?  value 22u
22 uF ±10% 25V Ceramic Capacitor X7R 1210 (3225 Metric); Manufacturer Part Number: CL32B226KAJNNNE; Manufacturer: Samsung Electro-Mechanics; Working Temperature: -55°C ~ 125°C; Short Description: CAP CER 22UF 25V X7R 1210; Power: NC; Ratings: REACH, ROHS3; Type: MLCC; Temperature Coefficient: X7R; Mounting: SMT; Frequency: NC; Alternate Part Number 1: *; Alternate Part Number 2: *; Tolerance: ±10%; Current: NC; Revision Date: 02/09/21; Package Reference: 1210; Voltage: 25V
footprint C1206 (Footprint not found)
pins: 1, 2

## CC226FMC1206
designator C?  value 22u
22 µF ±20% 25V Ceramic Capacitor X5R 1206 (3216 Metric); Manufacturer Part Number: GRT31CR61E226ME01L; Manufacturer: Murata Electronics; Working Temperature: -55°C ~ 85°C; Short Description: CAP CER 22UF 25V X5R 1206; Power: NC; Ratings: REACH, ROHS3, AEQ-200; Type: MLCC; Temperature Coefficient: X5R; Mounting: SMT; Frequency: NC; Alternate Part Number 1: *; Alternate Part Number 2: *; Tolerance: ±20%; Current: NC; Revision Date: 03/08/21; Package Reference: 1206; Voltage: 25V
footprint C1206 (Footprint not found)
pins: 1, 2

## CC336BMC1206W
designator C?  value 33u
33 µF ±20% 6.3V Ceramic Capacitor X5R 1206 (3216 Metric); Manufacturer Part Number: C3216X5R0J336M; Manufacturer: TDK Corporation; Working Temperature: -55°C ~ 85°C; Short Description: CAP CER 33UF 6.3V X5R 1206; Power: NC; Ratings: REACH, ROHS3; Type: MLCC; Temperature Coefficient: X5R; Mounting: SMT; Frequency: NC; Alternate Part Number 1: *; Alternate Part Number 2: *; Tolerance: ±20%; Current: NC; Revision Date: 03/08/21; Package Reference: 1206; Voltage: 6.3V
footprint C1206 (Footprint not found)
pins: 1, 2

## CC475HKC1206W
designator C?  value 4.7u
4.7 µF ±10% 50V Ceramic Capacitor X5R 1206 (3216 Metric); Manufacturer Part Number: UMK316BJ475KL-T; Manufacturer: Taiyo Yuden; Working Temperature: -55°C ~ 85°C; Short Description: CAP CER 4.7UF 50V X5R 1206; Power: NC; Ratings: REACH, ROHS3; Type: MLCC; Temperature Coefficient: X5R; Mounting: SMT; Frequency: NC; Alternate Part Number 1: *; Alternate Part Number 2: *; Tolerance: ±10%; Current: NC; Revision Date: 03/08/21; Package Reference: 1206; Voltage: 50V
footprint C1206 (Footprint not found)
pins: 1, 2
